# Altium schematic symbol library Standard2.SchLib: 531 symbols (part 2 of 7) (continued)
## DISP_LCD_S6B33B6_15IN33PIN (continued)
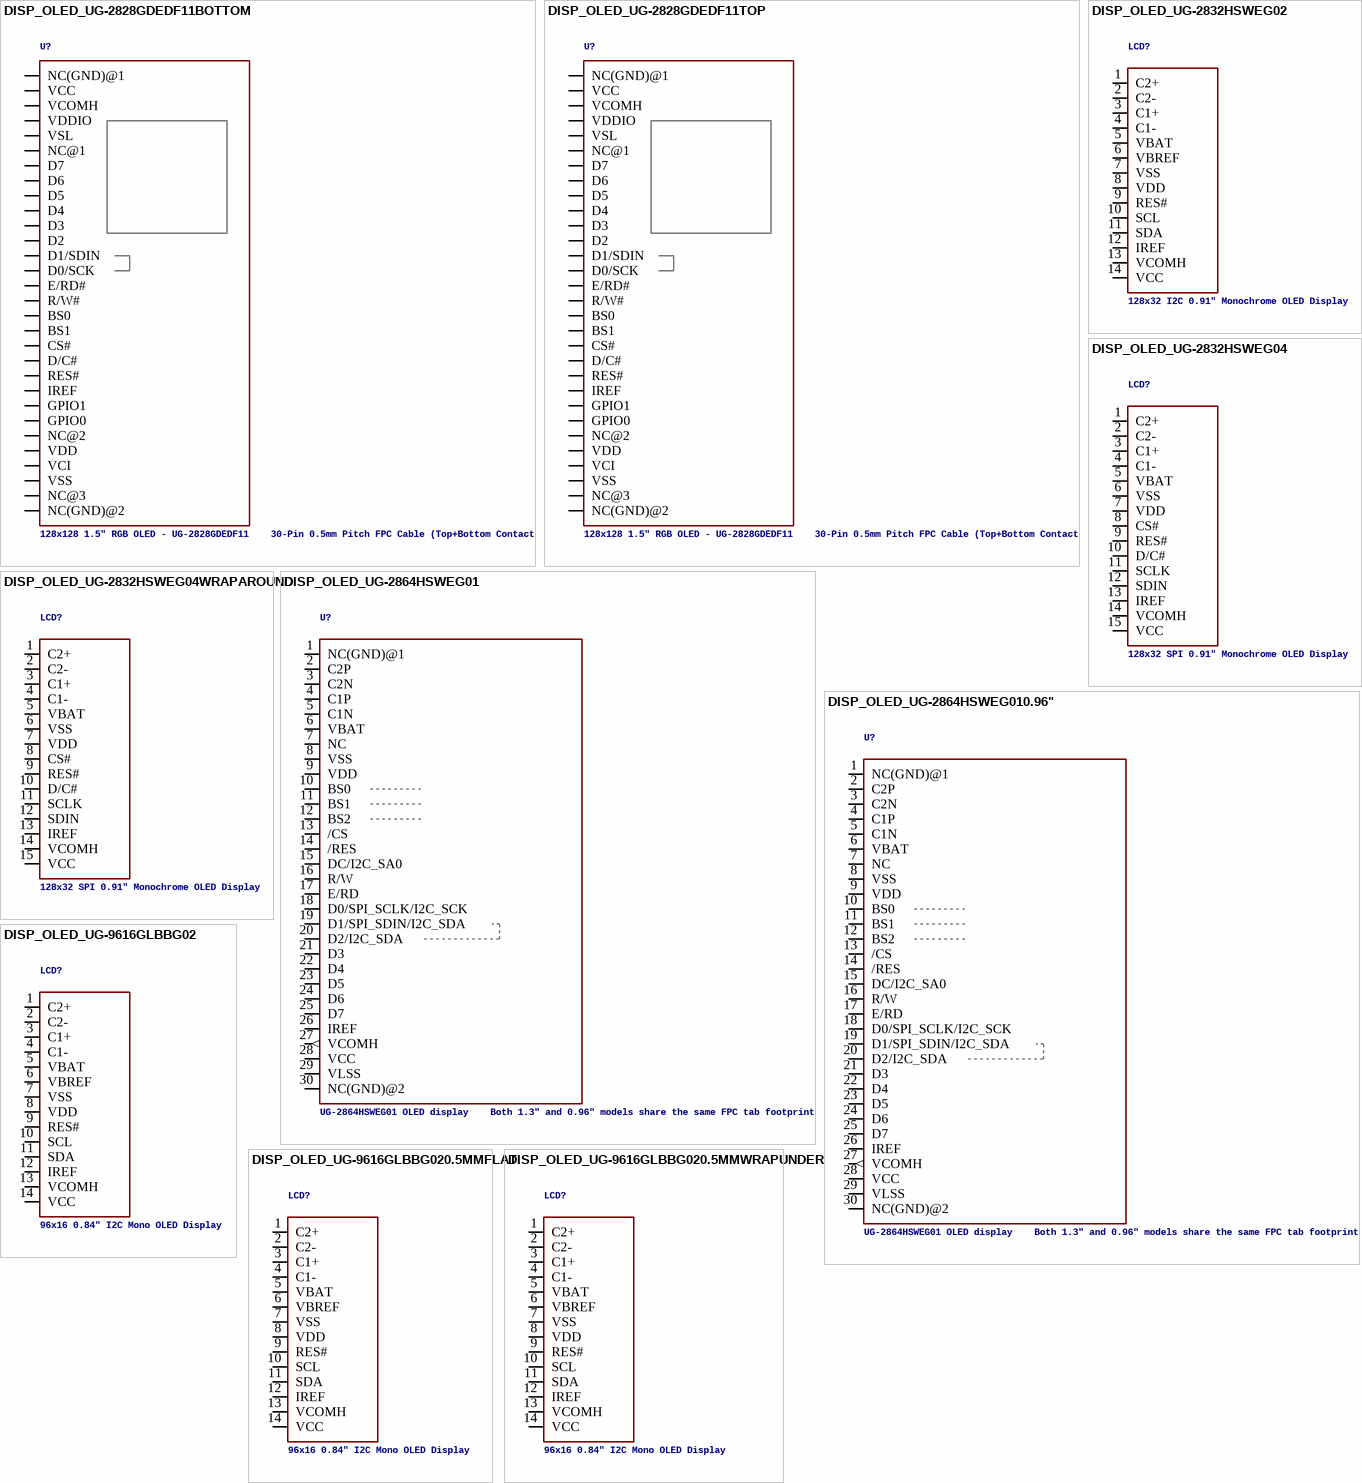
[diagram p7: symbols DISP_OLED_UG-2828GDEDF11BOTTOM to DISP_OLED_UG-9616GLBBG020.5MMWRAPUNDER]

## DISP_OLED_UG-2828GDEDF11BOTTOM
designator U?, comment 128x128 1.5" RGB OLED - UG-2828GDEDF11    30-Pin 0.5mm Pitch FPC Cable (Top+Bottom Contacts) - OMRON XF2M-3015-1A (Digikey: OR723TR-ND)   This FPC connector has contacts on the top and bottom, but the appropriate pin needs to be selected depending on whether the OLED will be inserted right-side up (use the TOP pinout) or upside-down (use the BOTTOM pinout).
footprint FPC_XF2M-3015-1A
pins: P$1 NC(GND)@1, P$2 VCC (power), P$3 VCOMH (power), P$4 VDDIO (power), P$5 VSL, P$6 NC@1, P$7 D7, P$8 D6, P$9 D5, P$10 D4, P$11 D3, P$12 D2, P$13 D1/SDIN, P$14 D0/SCK, P$15 E/RD#, P$16 R/W#, P$17 BS0, P$18 BS1, P$19 CS#, P$20 D/C#, P$21 RES#, P$22 IREF, P$23 GPIO1, P$24 GPIO0, P$25 NC@2, P$26 VDD (power), P$27 VCI (power), P$28 VSS (power), P$29 NC@3, P$30 NC(GND)@2

## DISP_OLED_UG-2828GDEDF11TOP
designator U?, comment 128x128 1.5" RGB OLED - UG-2828GDEDF11    30-Pin 0.5mm Pitch FPC Cable (Top+Bottom Contacts) - OMRON XF2M-3015-1A (Digikey: OR723TR-ND)   This FPC connector has contacts on the top and bottom, but the appropriate pin needs to be selected depending on whether the OLED will be inserted right-side up (use the TOP pinout) or upside-down (use the BOTTOM pinout).
footprint FPC_XF2M-3015-1A
pins: P$1 NC(GND)@2, P$2 NC@3, P$3 VSS (power), P$4 VCI (power), P$5 VDD (power), P$6 NC@2, P$7 GPIO0, P$8 GPIO1, P$9 IREF, P$10 RES#, P$11 D/C#, P$12 CS#, P$13 BS1, P$14 BS0, P$15 R/W#, P$16 E/RD#, P$17 D0/SCK, P$18 D1/SDIN, P$19 D2, P$20 D3, P$21 D4, P$22 D5, P$23 D6, P$24 D7, P$25 NC@1, P$26 VSL, P$27 VDDIO (power), P$28 VCOMH (power), P$29 VCC (power), P$30 NC(GND)@1

## DISP_OLED_UG-2832HSWEG02
designator LCD?, comment 128x32 I2C 0.91" Monochrome OLED Display
footprint UG-2832HSWEG02_WRAPUNDER
pins: 1 C2+, 2 C2-, 3 C1+, 4 C1-, 5 VBAT (power), 6 VBREF (power), 7 VSS (power), 8 VDD (power), 9 RES#, 10 SCL, 11 SDA, 12 IREF, 13 VCOMH (power), 14 VCC (power)

## DISP_OLED_UG-2832HSWEG04
designator LCD?, comment 128x32 SPI 0.91" Monochrome OLED Display
footprint UG-2832HSWEG04
pins: 1 C2+, 2 C2-, 3 C1+, 4 C1-, 5 VBAT, 6 VSS, 7 VDD, 8 CS#, 9 RES#, 10 D/C#, 11 SCLK, 12 SDIN, 13 IREF, 14 VCOMH, 15 VCC

## DISP_OLED_UG-2832HSWEG04WRAPAROUND
designator LCD?, comment 128x32 SPI 0.91" Monochrome OLED Display
footprint UG-2832HSWEG04_WRAPAROUND
pins: 1 C2+, 2 C2-, 3 C1+, 4 C1-, 5 VBAT, 6 VSS, 7 VDD, 8 CS#, 9 RES#, 10 D/C#, 11 SCLK, 12 SDIN, 13 IREF, 14 VCOMH, 15 VCC

## DISP_OLED_UG-2864HSWEG01
designator U?, comment UG-2864HSWEG01 OLED display    Both 1.3" and 0.96" models share the same FPC tab footprint, only the screen dimensions vary.
footprint UG-2864HSWEG01_1.3_WRAPAROUND
pins: 1 NC(GND)@1, 2 C2P, 3 C2N, 4 C1P, 5 C1N, 6 VBAT, 7 NC, 8 VSS (power), 9 VDD (power), 10 BS0, 11 BS1, 12 BS2, 13 /CS, 14 /RES, 15 DC/I2C_SA0, 16 R/W, 17 E/RD, 18 D0/SPI_SCLK/I2C_SCK, 19 D1/SPI_SDIN/I2C_SDA, 20 D2/I2C_SDA, 21 D3, 22 D4, 23 D5, 24 D6, 25 D7, 26 IREF, 27 VCOMH (out), 28 VCC (power), 29 VLSS (power), 30 NC(GND)@2

## DISP_OLED_UG-2864HSWEG010.96"
designator U?, comment UG-2864HSWEG01 OLED display    Both 1.3" and 0.96" models share the same FPC tab footprint, only the screen dimensions vary.
footprint UG-2864HSWEG01_0.96IN_WRAPAROUND
pins: 1 NC(GND)@1, 2 C2P, 3 C2N, 4 C1P, 5 C1N, 6 VBAT, 7 NC, 8 VSS (power), 9 VDD (power), 10 BS0, 11 BS1, 12 BS2, 13 /CS, 14 /RES, 15 DC/I2C_SA0, 16 R/W, 17 E/RD, 18 D0/SPI_SCLK/I2C_SCK, 19 D1/SPI_SDIN/I2C_SDA, 20 D2/I2C_SDA, 21 D3, 22 D4, 23 D5, 24 D6, 25 D7, 26 IREF, 27 VCOMH (out), 28 VCC (power), 29 VLSS (power), 30 NC(GND)@2

## DISP_OLED_UG-9616GLBBG02
designator LCD?, comment 96x16 0.84" I2C Mono OLED Display
footprint UG-9616GLBBG02_0.65MM_WRAPAROUND
pins: 1 C2+, 2 C2-, 3 C1+, 4 C1-, 5 VBAT, 6 VBREF, 7 VSS, 8 VDD, 9 RES#, 10 SCL, 11 SDA, 12 IREF, 13 VCOMH, 14 VCC

## DISP_OLED_UG-9616GLBBG020.5MMFLAT
designator LCD?, comment 96x16 0.84" I2C Mono OLED Display
footprint UG-9616GLBBG02
pins: 1 C2+, 2 C2-, 3 C1+, 4 C1-, 5 VBAT, 6 VBREF, 7 VSS, 8 VDD, 9 RES#, 10 SCL, 11 SDA, 12 IREF, 13 VCOMH, 14 VCC

## DISP_OLED_UG-9616GLBBG020.5MMWRAPUNDER
designator LCD?, comment 96x16 0.84" I2C Mono OLED Display
footprint UG-9616GLBBG02_WRAPAROUND
pins: 1 C2+, 2 C2-, 3 C1+, 4 C1-, 5 VBAT, 6 VBREF, 7 VSS, 8 VDD, 9 RES#, 10 SCL, 11 SDA, 12 IREF, 13 VCOMH, 14 VCC

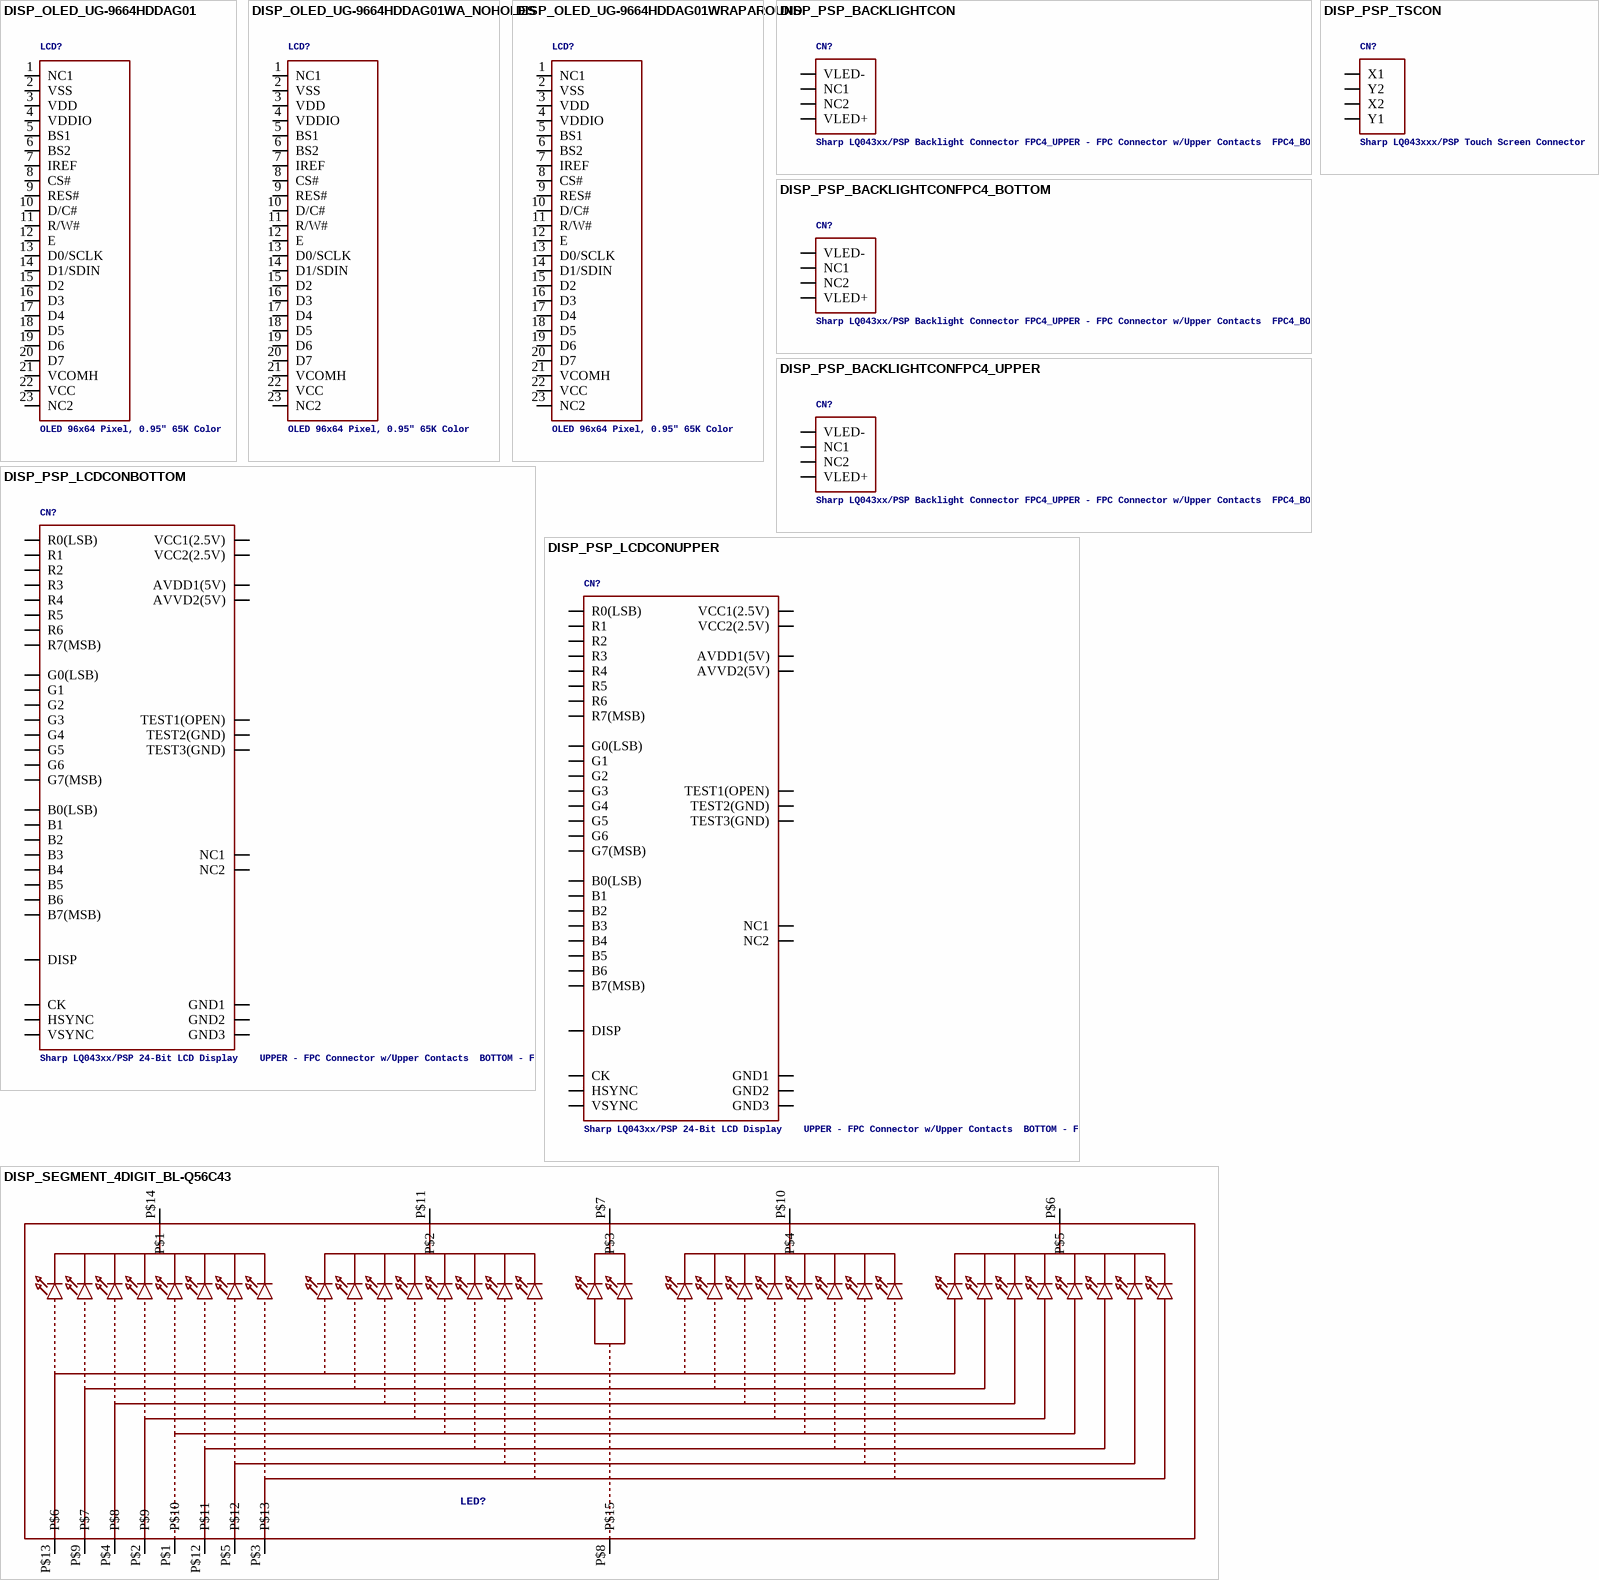
[diagram p8: symbols DISP_OLED_UG-9664HDDAG01 to DISP_SEGMENT_4DIGIT_BL-Q56C43]

## DISP_OLED_UG-9664HDDAG01
designator LCD?, comment OLED 96x64 Pixel, 0.95" 65K Color
footprint UG-9664HDDAG01
pins: 1 NC1, 2 VSS, 3 VDD, 4 VDDIO, 5 BS1, 6 BS2, 7 IREF, 8 CS#, 9 RES#, 10 D/C#, 11 R/W#, 12 E, 13 D0/SCLK, 14 D1/SDIN, 15 D2, 16 D3, 17 D4, 18 D5, 19 D6, 20 D7, 21 VCOMH, 22 VCC, 23 NC2

## DISP_OLED_UG-9664HDDAG01WA_NOHOLES
designator LCD?, comment OLED 96x64 Pixel, 0.95" 65K Color
footprint UG-9664HDDAG01_WRAPAROUND_NOHOLES
pins: 1 NC1, 2 VSS, 3 VDD, 4 VDDIO, 5 BS1, 6 BS2, 7 IREF, 8 CS#, 9 RES#, 10 D/C#, 11 R/W#, 12 E, 13 D0/SCLK, 14 D1/SDIN, 15 D2, 16 D3, 17 D4, 18 D5, 19 D6, 20 D7, 21 VCOMH, 22 VCC, 23 NC2

## DISP_OLED_UG-9664HDDAG01WRAPAROUND
designator LCD?, comment OLED 96x64 Pixel, 0.95" 65K Color
footprint UG-9664HDDAG01_WRAPAROUND
pins: 1 NC1, 2 VSS, 3 VDD, 4 VDDIO, 5 BS1, 6 BS2, 7 IREF, 8 CS#, 9 RES#, 10 D/C#, 11 R/W#, 12 E, 13 D0/SCLK, 14 D1/SDIN, 15 D2, 16 D3, 17 D4, 18 D5, 19 D6, 20 D7, 21 VCOMH, 22 VCC, 23 NC2

## DISP_PSP_BACKLIGHTCON
designator CN?, comment Sharp LQ043xx/PSP Backlight Connector FPC4_UPPER - FPC Connector w/Upper Contacts  FPC4_BOTTOM - FPC Connector w/Bottom Contacts       Use the UPPER connector if the LCD connector is on one side of the board and the screen will be wrapped around the edge onto the other side of the board (which is what normally happens).   Use the BOTTOM connector if the LCD and the connector are on the same side of the board (the cable with be folded directly underneath the screen).
footprint PSP_BACKLIGHTCON
pins: NC1, NC2, VLED+ (power), VLED- (power)

## DISP_PSP_BACKLIGHTCONFPC4_BOTTOM
designator CN?, comment Sharp LQ043xx/PSP Backlight Connector FPC4_UPPER - FPC Connector w/Upper Contacts  FPC4_BOTTOM - FPC Connector w/Bottom Contacts       Use the UPPER connector if the LCD connector is on one side of the board and the screen will be wrapped around the edge onto the other side of the board (which is what normally happens).   Use the BOTTOM connector if the LCD and the connector are on the same side of the board (the cable with be folded directly underneath the screen).
footprint FPC4PIN
pins: 1 VLED+ (power), 2 NC2, 3 NC1, 4 VLED- (power)

## DISP_PSP_BACKLIGHTCONFPC4_UPPER
designator CN?, comment Sharp LQ043xx/PSP Backlight Connector FPC4_UPPER - FPC Connector w/Upper Contacts  FPC4_BOTTOM - FPC Connector w/Bottom Contacts       Use the UPPER connector if the LCD connector is on one side of the board and the screen will be wrapped around the edge onto the other side of the board (which is what normally happens).   Use the BOTTOM connector if the LCD and the connector are on the same side of the board (the cable with be folded directly underneath the screen).
footprint FPC4PIN
pins: 1 VLED- (power), 2 NC1, 3 NC2, 4 VLED+ (power)

## DISP_PSP_LCDCONBOTTOM
designator CN?, comment Sharp LQ043xx/PSP 24-Bit LCD Display    UPPER - FPC Connector w/Upper Contacts  BOTTOM - FPC Connector w/Bottom Contacts       Use the UPPER connector if the LCD connector is on one side of the board and the LCD will be wrapped around the edge onto the other side of the board (which is what normally happens).   Use the BOTTOM connector if the LCD and the connector are on the same side of the board (the cable with be folded directly underneath the LCD).
footprint FPC40PIN
pins: P$1 GND1 (power), P$2 GND2 (power), P$3 VCC1(2.5V) (power), P$4 VCC2(2.5V) (power), P$5 R0(LSB), P$6 R1, P$7 R2, P$8 R3, P$9 R4, P$10 R5, P$11 R6, P$12 R7(MSB), P$13 G0(LSB), P$14 G1, P$15 G2, P$16 G3, P$17 G4, P$18 G5, P$19 G6, P$20 G7(MSB), P$21 B0(LSB), P$22 B1, P$23 B2, P$24 B3, P$25 B4, P$26 B5, P$27 B6, P$28 B7(MSB), P$29 GND3 (power), P$30 CK, P$31 DISP, P$32 HSYNC, P$33 VSYNC, P$34 NC1, P$35 AVDD1(5V), P$36 AVVD2(5V), P$37 NC2, P$38 TEST1(OPEN), P$39 TEST2(GND), P$40 TEST3(GND)

## DISP_PSP_LCDCONUPPER
designator CN?, comment Sharp LQ043xx/PSP 24-Bit LCD Display    UPPER - FPC Connector w/Upper Contacts  BOTTOM - FPC Connector w/Bottom Contacts       Use the UPPER connector if the LCD connector is on one side of the board and the LCD will be wrapped around the edge onto the other side of the board (which is what normally happens).   Use the BOTTOM connector if the LCD and the connector are on the same side of the board (the cable with be folded directly underneath the LCD).
footprint FPC40PIN
pins: P$1 TEST3(GND), P$2 TEST2(GND), P$3 TEST1(OPEN), P$4 NC2, P$5 AVVD2(5V), P$6 AVDD1(5V), P$7 NC1, P$8 VSYNC, P$9 HSYNC, P$10 DISP, P$11 CK, P$12 GND3 (power), P$13 B7(MSB), P$14 B6, P$15 B5, P$16 B4, P$17 B3, P$18 B2, P$19 B1, P$20 B0(LSB), P$21 G7(MSB), P$22 G6, P$23 G5, P$24 G4, P$25 G3, P$26 G2, P$27 G1, P$28 G0(LSB), P$29 R7(MSB), P$30 R6, P$31 R5, P$32 R4, P$33 R3, P$34 R2, P$35 R1, P$36 R0(LSB), P$37 VCC2(2.5V) (power), P$38 VCC1(2.5V) (power), P$39 GND2 (power), P$40 GND1 (power)

## DISP_PSP_TSCON
designator CN?, comment Sharp LQ043xxx/PSP Touch Screen Connector
footprint PSP_TSCON
pins: X1, X2, Y1, Y2

## DISP_SEGMENT_4DIGIT_BL-Q56C43
designator LED?
footprint SEGMENT-BL-Q56C43
pins: P$1 P$10, P$2 P$9, P$3 P$13, P$4 P$8, P$5 P$12, P$6 P$5, P$7 P$3, P$8 P$15, P$9 P$7, P$10 P$4, P$11 P$2, P$12 P$11, P$13 P$6, P$14 P$1

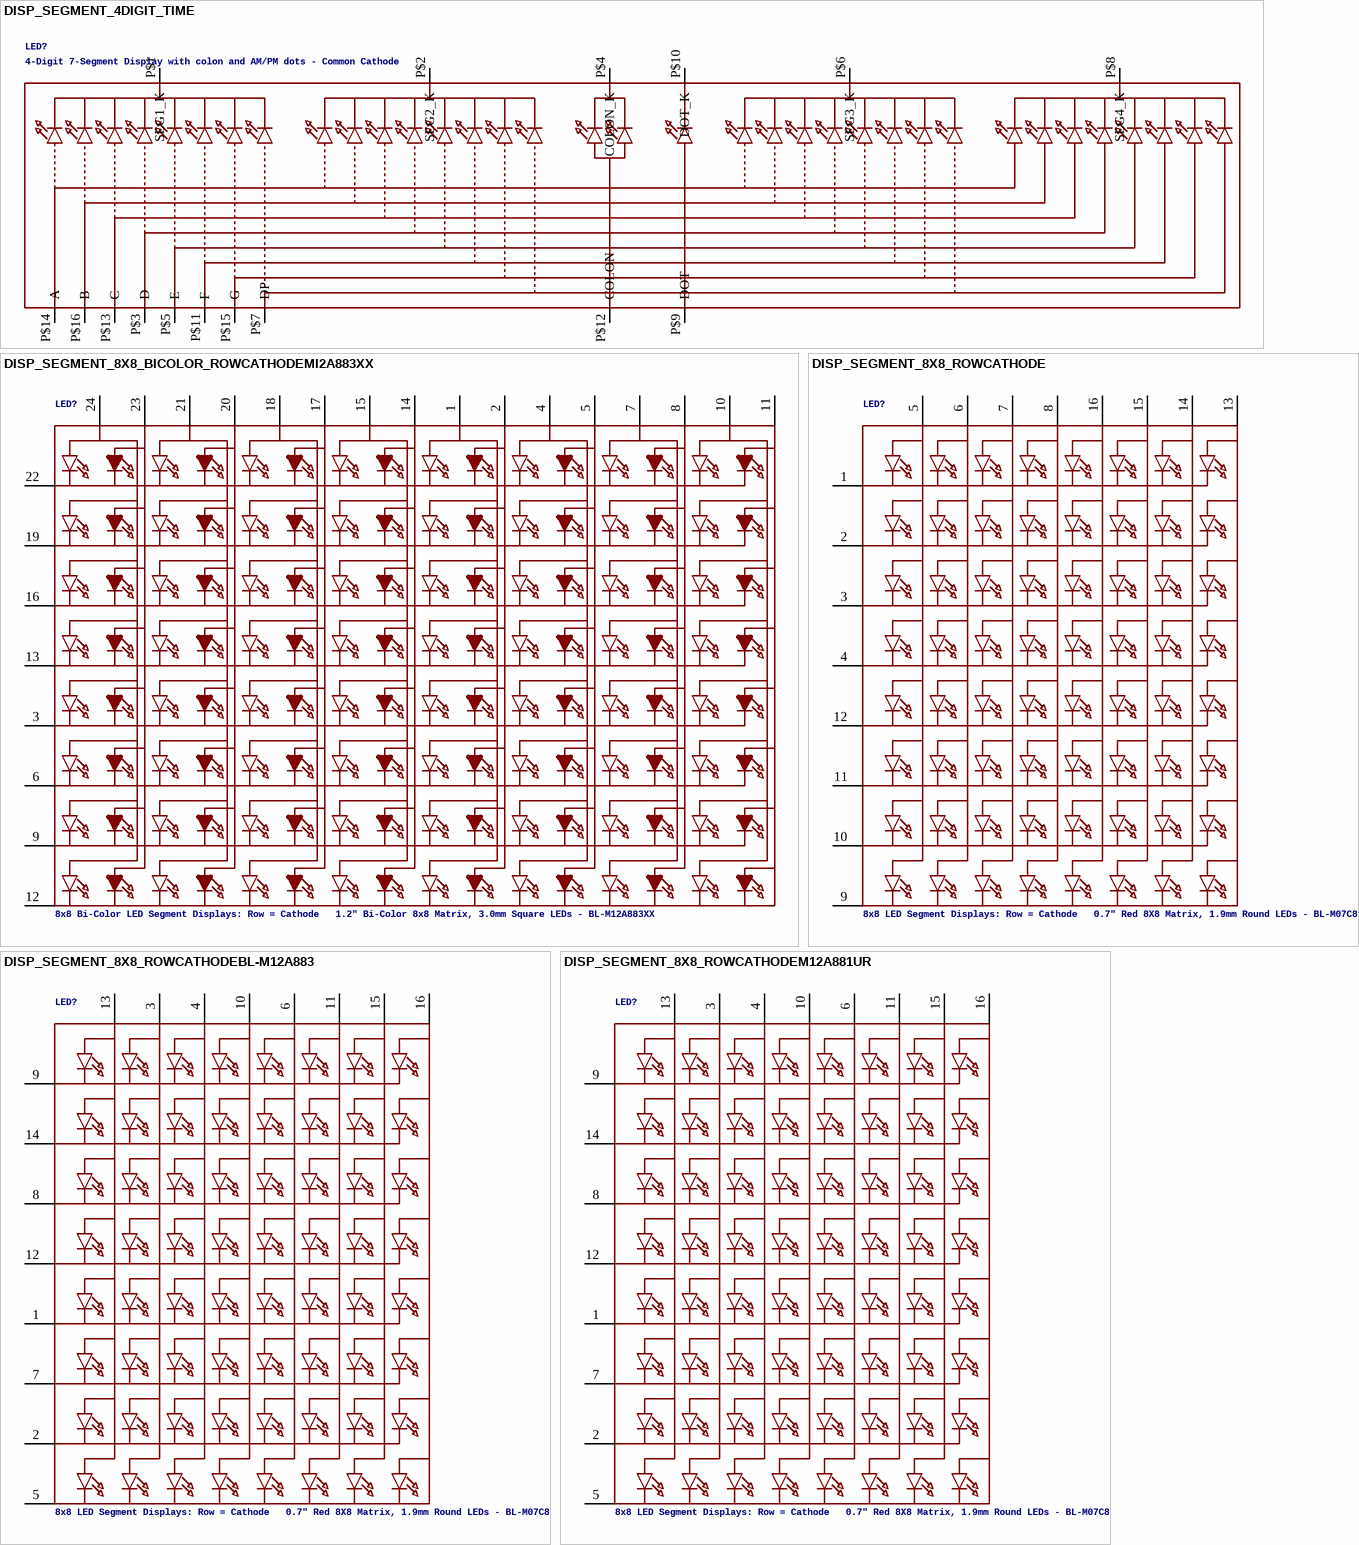
[diagram p9: symbols DISP_SEGMENT_4DIGIT_TIME to DISP_SEGMENT_8X8_ROWCATHODEM12A881UR]

## DISP_SEGMENT_4DIGIT_TIME
designator LED?, comment 4-Digit 7-Segment Display with colon and AM/PM dots - Common Cathode
footprint SEGMENT_BL-Q39A-42
pins: P$1 SEG1_K, P$2 SEG2_K, P$3 D, P$4 COLON_K, P$5 E, P$6 SEG3_K, P$7 DP, P$8 SEG4_K, P$9 DOT, P$10 DOT_K, P$11 F, P$12 COLON, P$13 C, P$14 A, P$15 G, P$16 B

## DISP_SEGMENT_8X8_BICOLOR_ROWCATHODEMI2A883XX
designator LED?, comment 8x8 Bi-Color LED Segment Displays: Row = Cathode   1.2" Bi-Color 8x8 Matrix, 3.0mm Square LEDs - BL-M12A883XX
footprint SEGMENT_BICOL_BL-M12A883XX
pins: 1 A9, 2 A10, 3 K5, 4 A11, 5 A12, 6 K6, 7 A13, 8 A14, 9 K7, 10 A15, 11 A16, 12 K8, 13 K4, 14 A8, 15 A7, 16 K3, 17 A6, 18 A5, 19 K2, 20 A4, 21 A3, 22 K1, 23 A2, 24 A1

## DISP_SEGMENT_8X8_ROWCATHODE
designator LED?, comment 8x8 LED Segment Displays: Row = Cathode   0.7" Red 8X8 Matrix, 1.9mm Round LEDs - BL-M07C881UR   1.2" Red 8x8 Matrix, 3.0mm Round LEDs - BL-M12A881UR   1.2" Red 8x8 Matrix, 3.0mm Square LEDs - BL-M12A883
footprint SEGMENT_BL-M07C881UR
pins: 1 K1, 2 K2, 3 K3, 4 K4, 5 A1, 6 A2, 7 A3, 8 A4, 9 K8, 10 K7, 11 K6, 12 K5, 13 A8, 14 A7, 15 A6, 16 A5

## DISP_SEGMENT_8X8_ROWCATHODEBL-M12A883
designator LED?, comment 8x8 LED Segment Displays: Row = Cathode   0.7" Red 8X8 Matrix, 1.9mm Round LEDs - BL-M07C881UR   1.2" Red 8x8 Matrix, 3.0mm Round LEDs - BL-M12A881UR   1.2" Red 8x8 Matrix, 3.0mm Square LEDs - BL-M12A883
footprint SEGMENT_BL-M12A883
pins: 1 K5, 2 K7, 3 A2, 4 A3, 5 K8, 6 A5, 7 K6, 8 K3, 9 K1, 10 A4, 11 A6, 12 K4, 13 A1, 14 K2, 15 A7, 16 A8

## DISP_SEGMENT_8X8_ROWCATHODEM12A881UR
designator LED?, comment 8x8 LED Segment Displays: Row = Cathode   0.7" Red 8X8 Matrix, 1.9mm Round LEDs - BL-M07C881UR   1.2" Red 8x8 Matrix, 3.0mm Round LEDs - BL-M12A881UR   1.2" Red 8x8 Matrix, 3.0mm Square LEDs - BL-M12A883
footprint SEGMENT_BL-M12A881UR
pins: 1 K5, 2 K7, 3 A2, 4 A3, 5 K8, 6 A5, 7 K6, 8 K3, 9 K1, 10 A4, 11 A6, 12 K4, 13 A1, 14 K2, 15 A7, 16 A8

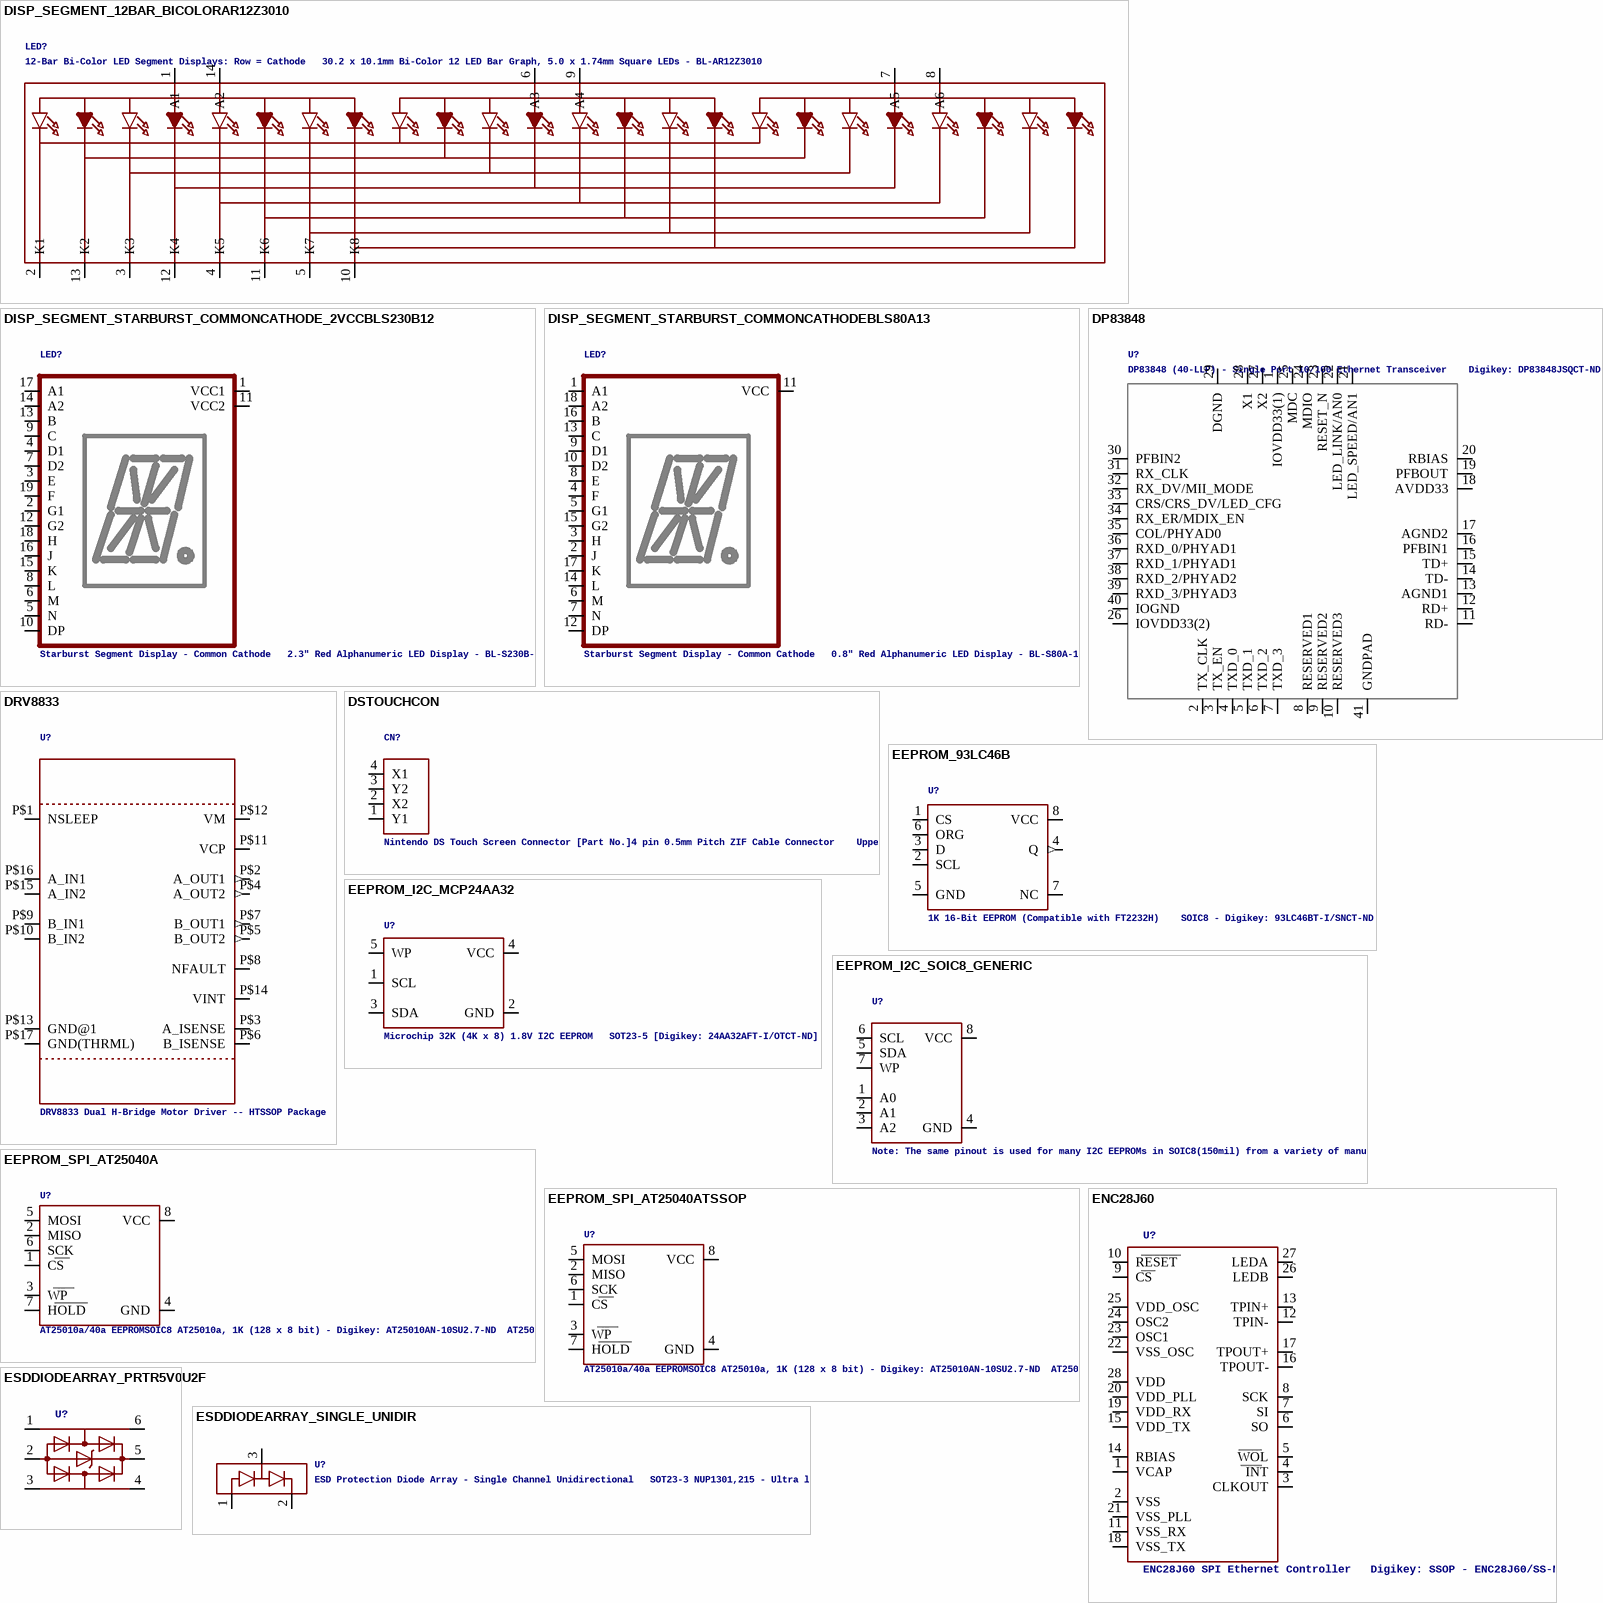
[diagram p10: symbols DISP_SEGMENT_12BAR_BICOLORAR12Z3010 to ESDDIODEARRAY_SINGLE_UNIDIR]

## DISP_SEGMENT_12BAR_BICOLORAR12Z3010
designator LED?, comment 12-Bar Bi-Color LED Segment Displays: Row = Cathode   30.2 x 10.1mm Bi-Color 12 LED Bar Graph, 5.0 x 1.74mm Square LEDs - BL-AR12Z3010
footprint SEGMENT_BICOL_BL-AR12Z3010
pins: 1 A1, 2 K1, 3 K3, 4 K5, 5 K7, 6 A3, 7 A5, 8 A6, 9 A4, 10 K8, 11 K6, 12 K4, 13 K2, 14 A2

## DISP_SEGMENT_STARBURST_COMMONCATHODE_2VCCBLS230B12
designator LED?, comment Starburst Segment Display - Common Cathode   2.3" Red Alphanumeric LED Display - BL-S230B-12
footprint SEGMENT_STARBURST_BL-S230B-12
pins: 1 VCC1 (power), 2 G1, 3 E, 4 D1, 5 N, 6 M, 7 D2, 8 L, 9 C, 10 DP, 11 VCC2 (power), 12 G2, 13 B, 14 A2, 15 K, 16 J, 17 A1, 18 H, 19 F

## DISP_SEGMENT_STARBURST_COMMONCATHODEBLS80A13
designator LED?, comment Starburst Segment Display - Common Cathode   0.8" Red Alphanumeric LED Display - BL-S80A-13UHR-11
footprint SEGMENT_STARBURST_BL-S80A-13
pins: 1 A1, 2 J, 3 H, 4 F, 5 G1, 6 M, 7 N, 8 E, 9 D1, 10 D2, 11 VCC (power), 12 DP, 13 C, 14 L, 15 G2, 16 B, 17 K, 18 A2

## DP83848
designator U?, comment DP83848 (40-LLP) - Single Port 10/100 Ethernet Transceiver    Digikey: DP83848JSQCT-ND
footprint LLP40
pins: 1 IOVDD33(1), 2 TX_CLK, 3 TX_EN, 4 TXD_0, 5 TXD_1, 6 TXD_2, 7 TXD_3, 8 RESERVED1, 9 RESERVED2, 10 RESERVED3, 11 RD-, 12 RD+, 13 AGND1, 14 TD-, 15 TD+, 16 PFBIN1, 17 AGND2, 18 AVDD33, 19 PFBOUT, 20 RBIAS, 21 LED_SPEED/AN1, 22 LED_LINK/AN0, 23 RESET_N, 24 MDIO, 25 MDC, 26 IOVDD33(2), 27 X2, 28 X1, 29 DGND, 30 PFBIN2, 31 RX_CLK, 32 RX_DV/MII_MODE, 33 CRS/CRS_DV/LED_CFG, 34 RX_ER/MDIX_EN, 35 COL/PHYAD0, 36 RXD_0/PHYAD1, 37 RXD_1/PHYAD1, 38 RXD_2/PHYAD2, 39 RXD_3/PHYAD3, 40 IOGND, 41 GNDPAD

## DRV8833
designator U?, comment DRV8833 Dual H-Bridge Motor Driver -- HTSSOP Package
footprint HTSSOP16
pins: P$1 NSLEEP, P$2 A_OUT1 (out), P$3 A_ISENSE, P$4 A_OUT2 (out), P$5 B_OUT2 (out), P$6 B_ISENSE, P$7 B_OUT1 (out), P$8 NFAULT, P$9 B_IN1, P$10 B_IN2, P$11 VCP, P$12 VM (power), P$13 GND@1 (power), P$14 VINT (power), P$15 A_IN2, P$16 A_IN1, P$17 GND(THRML) (power)

## DSTOUCHCON
designator CN?, comment Nintendo DS Touch Screen Connector [Part No.]4 pin 0.5mm Pitch ZIF Cable Connector    Upper Contacts - 4UConnector: 08644 Bottom Contacts - 4UConnector: 11793
footprint FPC4PIN
pins: 1 Y1, 2 X2, 3 Y2, 4 X1

## EEPROM_93LC46B
designator U?, comment 1K 16-Bit EEPROM (Compatible with FT2232H)    SOIC8 - Digikey: 93LC46BT-I/SNCT-ND
footprint SOIC8_150MIL
pins: 1 CS, 2 SCL, 3 D, 4 Q (out), 5 GND (power), 6 ORG, 7 NC, 8 VCC (power)

## EEPROM_I2C_MCP24AA32
designator U?, comment Microchip 32K (4K x 8) 1.8V I2C EEPROM   SOT23-5 [Digikey: 24AA32AFT-I/OTCT-ND]
footprint SOT23-5
pins: 1 SCL, 2 GND, 3 SDA, 4 VCC, 5 WP

## EEPROM_I2C_SOIC8_GENERIC
designator U?, comment Note: The same pinout is used for many I2C EEPROMs in SOIC8(150mil) from a variety of manufacturers and in various sizes.   Examples:   16K (2K x 8 Bit) I2C EEPROM 1.7-5.5V, 400KHz, -40Â°C-85Â°C Digikey: CAT24C16WI-GT3CT-ND   256K (32K x 8 Bit) I2C EEPROM 1.7-5.5V, 400KHz, -40Â°C-85Â°C Digikey: 24AA256-I/SN-ND
footprint SOIC8_150MIL
pins: 1 A0, 2 A1, 3 A2, 4 GND (power), 5 SDA, 6 SCL, 7 WP, 8 VCC (power)

## EEPROM_SPI_AT25040A
designator U?, comment AT25010a/40a EEPROMSOIC8 AT25010a, 1K (128 x 8 bit) - Digikey: AT25010AN-10SU2.7-ND  AT25040a, 4K (256 x 8 bit) - Digikey: AT25040AN-10SU1.8-ND    TSSOP8 AT25010a, 1K (128 x 8 bit) - Digikey: AT25010A-10TU-1.8-ND  AT25040a, 4K (256 x 8 bit) - Digikey: AT25040A-10TU-1.8-ND
footprint SOIC8_150MIL
pins: 1 CS, 2 MISO, 3 WP, 4 GND (power), 5 MOSI, 6 SCK, 7 HOLD, 8 VCC (power)

## EEPROM_SPI_AT25040ATSSOP
designator U?, comment AT25010a/40a EEPROMSOIC8 AT25010a, 1K (128 x 8 bit) - Digikey: AT25010AN-10SU2.7-ND  AT25040a, 4K (256 x 8 bit) - Digikey: AT25040AN-10SU1.8-ND    TSSOP8 AT25010a, 1K (128 x 8 bit) - Digikey: AT25010A-10TU-1.8-ND  AT25040a, 4K (256 x 8 bit) - Digikey: AT25040A-10TU-1.8-ND
footprint TSSOP8-4.4MM
pins: 1 CS, 2 MISO, 3 WP, 4 GND (power), 5 MOSI, 6 SCK, 7 HOLD, 8 VCC (power)

## ENC28J60
designator U?, comment ENC28J60 SPI Ethernet Controller   Digikey: SSOP - ENC28J60/SS-ND
footprint SSOP28DB
pins: 1 VCAP, 2 VSS, 3 CLKOUT, 4 INT, 5 WOL, 6 SO, 7 SI, 8 SCK, 9 CS, 10 RESET, 11 VSS_RX, 12 TPIN-, 13 TPIN+, 14 RBIAS, 15 VDD_TX, 16 TPOUT-, 17 TPOUT+, 18 VSS_TX, 19 VDD_RX, 20 VDD_PLL, 21 VSS_PLL, 22 VSS_OSC, 23 OSC1, 24 OSC2, 25 VDD_OSC, 26 LEDB, 27 LEDA, 28 VDD

## ESDDIODEARRAY_PRTR5V0U2F
designator U?
footprint SOT886
pins: 1 I/O1_1, 2 GND, 3 I/O2_1, 4 I/O2_2, 5 VBUS, 6 I/O1_2

## ESDDIODEARRAY_SINGLE_UNIDIR
designator U?, comment ESD Protection Diode Array - Single Channel Unidirectional   SOT23-3 NUP1301,215 - Ultra low capacitance (0.6pF), Rev Voltage 80V, Forward Current: 215mA - Digikey: 568-6351-1-ND
footprint SOT23-WIDE
pins: 1 GNDPIN (power), 2 SUPPLYPIN (power), 3 IO
